# Altium footprint library Connector-Header.PcbLib: 166 footprints (part 8 of 11)
Each footprint in its own frame and in the unit in brackets; x right, y up, seen from the top. Pads: shape width x height; smd on the part's side, far side on the other; paste and mask are expansions set on the pad; w line width, h text height; cw(c..) or ccw(c..) is an arc to the next point about the centre after c.
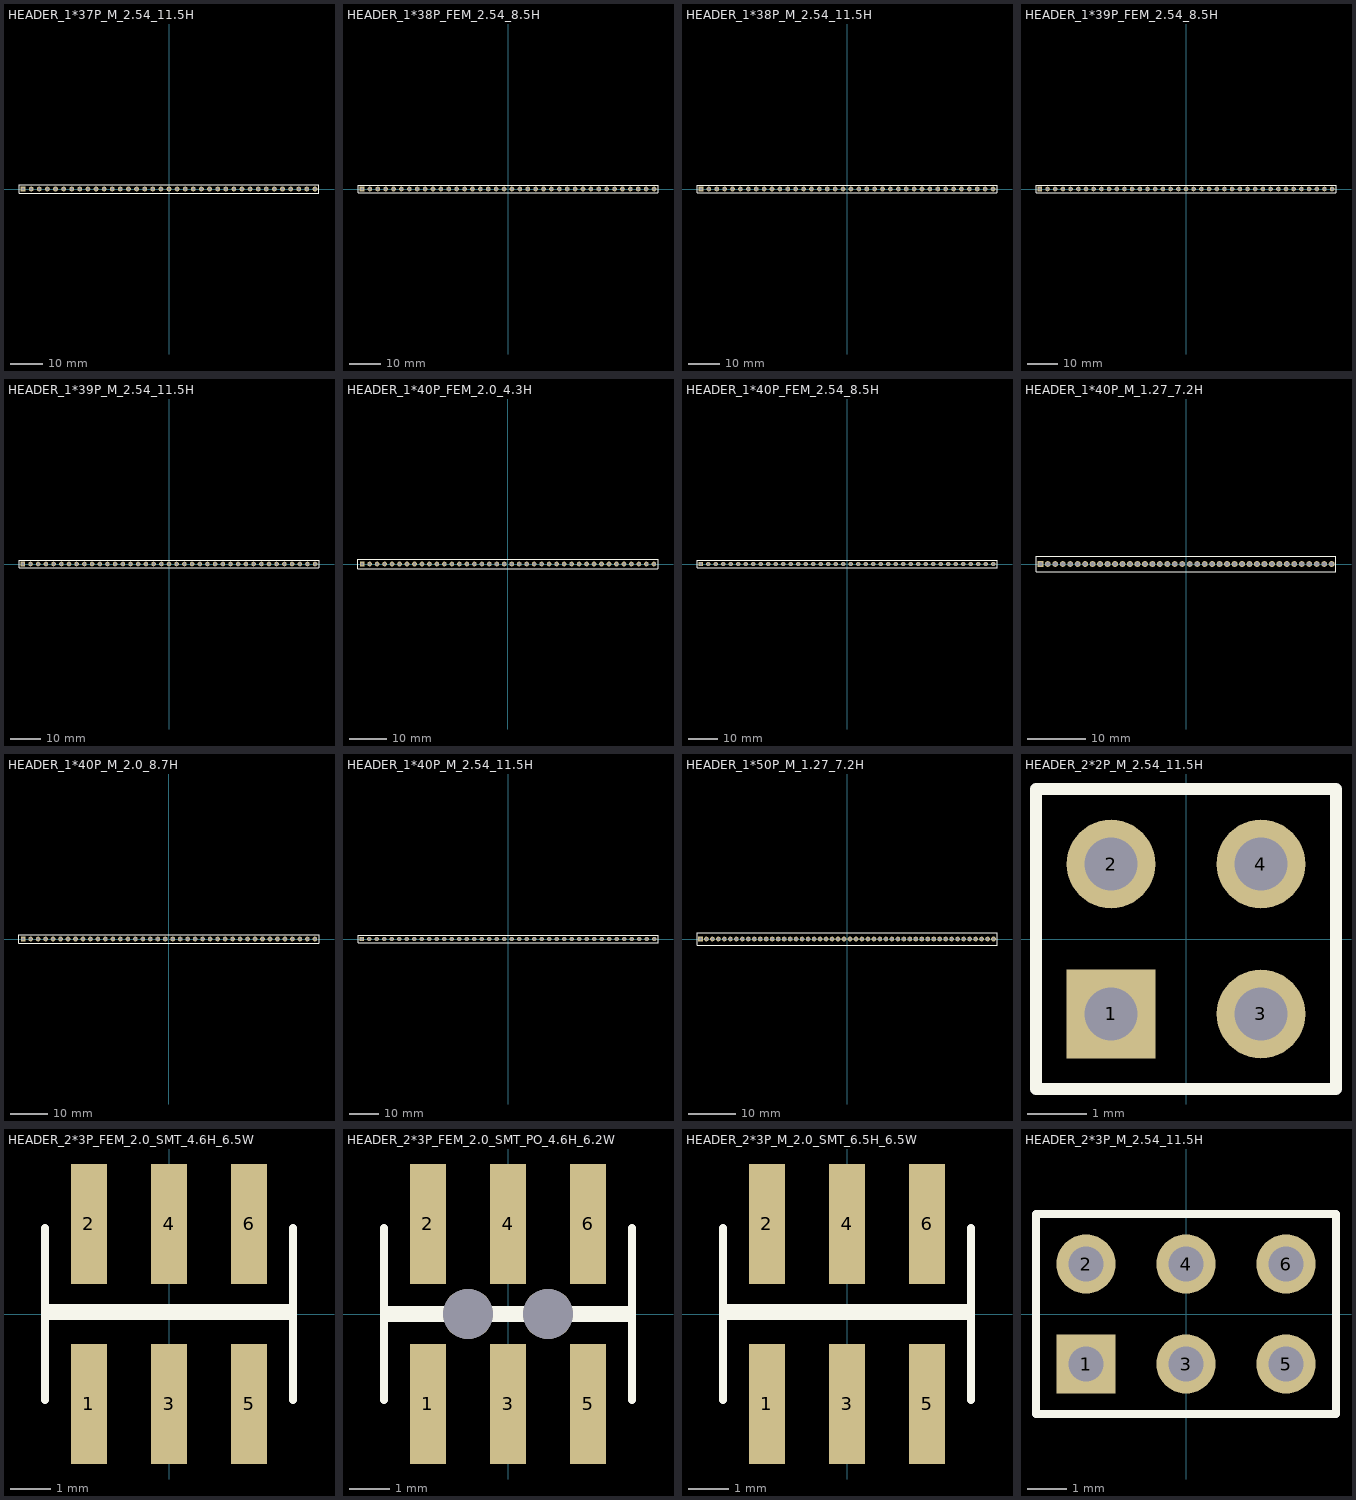
[diagram p7: the footprints below, top view; thin cyan lines are the x and y axes]

## HEADER_1*37P_M_2.54_11.5H [mm] "Connector; Header; 37 Position"
pads (37):
  rect 1.5x1.5 hole 0.9: 1(-45.72,0)
  round 1.5 hole 0.9: 2(-43.18,0) 3(-40.64,0) 4(-38.1,0) 5(-35.56,0) 6(-33.02,0) 7(-30.48,0) 8(-27.94,0) 9(-25.4,0) 10(-22.86,0) 11(-20.32,0) 12(-17.78,0) 13(-15.24,0) 14(-12.7,0) 15(-10.16,0) 16(-7.62,0) 17(-5.08,0) 18(-2.54,0) 19(0,0) 20(2.54,0) 21(5.08,0) 22(7.62,0) 23(10.16,0) 24(12.7,0) 25(15.24,0) 26(17.78,0) 27(20.32,0) 28(22.86,0) 29(25.4,0) 30(27.94,0) 31(30.48,0) 32(33.02,0) 33(35.56,0) 34(38.1,0) 35(40.64,0) 36(43.18,0) 37(45.72,0)
Top Overlay:
  lines w0.2: -46.99,-1.27 46.99,-1.27 46.99,1.27 -45.085,1.27 -46.99,1.27 -46.99,-1.27
3D body "PinHeader_1x37_P2.54mm_Vertical.step": height 8.54, standoff -3, extent -46.99,-1.27 46.99,1.27

## HEADER_1*38P_FEM_2.54_8.5H [mm] "Connector; Header; 38 Position"
pads (38):
  rect 1.5x1.5 hole 0.9: 1(-46.99,0)
  round 1.5 hole 0.9: 2(-44.45,0) 3(-41.91,0) 4(-39.37,0) 5(-36.83,0) 6(-34.29,0) 7(-31.75,0) 8(-29.21,0) 9(-26.67,0) 10(-24.13,0) 11(-21.59,0) 12(-19.05,0) 13(-16.51,0) 14(-13.97,0) 15(-11.43,0) 16(-8.89,0) 17(-6.35,0) 18(-3.81,0) 19(-1.27,0) 20(1.27,0) 21(3.81,0) 22(6.35,0) 23(8.89,0) 24(11.43,0) 25(13.97,0) 26(16.51,0) 27(19.05,0) 28(21.59,0) 29(24.13,0) 30(26.67,0) 31(29.21,0) 32(31.75,0) 33(34.29,0) 34(36.83,0) 35(39.37,0) 36(41.91,0) 37(44.45,0) 38(46.99,0)
Top Overlay:
  lines w0.2: 48.235,-1.27 -48.26,-1.27 -48.26,1.27 -46.355,1.27 48.26,1.27 48.26,-1.27
3D body "PinSocket_1x38_P2.54mm_Vertical.step": height 7, standoff -3.1, extent -48.26,-1.27 48.26,1.27

## HEADER_1*38P_M_2.54_11.5H [mm] "Connector; Header; 38 Position"
pads (38):
  rect 1.5x1.5 hole 0.9: 1(-46.99,0)
  round 1.5 hole 0.9: 2(-44.45,0) 3(-41.91,0) 4(-39.37,0) 5(-36.83,0) 6(-34.29,0) 7(-31.75,0) 8(-29.21,0) 9(-26.67,0) 10(-24.13,0) 11(-21.59,0) 12(-19.05,0) 13(-16.51,0) 14(-13.97,0) 15(-11.43,0) 16(-8.89,0) 17(-6.35,0) 18(-3.81,0) 19(-1.27,0) 20(1.27,0) 21(3.81,0) 22(6.35,0) 23(8.89,0) 24(11.43,0) 25(13.97,0) 26(16.51,0) 27(19.05,0) 28(21.59,0) 29(24.13,0) 30(26.67,0) 31(29.21,0) 32(31.75,0) 33(34.29,0) 34(36.83,0) 35(39.37,0) 36(41.91,0) 37(44.45,0) 38(46.99,0)
Top Overlay:
  lines w0.2: 48.235,-1.27 -48.26,-1.27 -48.26,1.27 -46.355,1.27 48.26,1.27 48.26,-1.27
3D body "PinHeader_1x38_P2.54mm_Vertical.step": height 8.54, standoff -3, extent -48.26,-1.27 48.26,1.27

## HEADER_1*39P_FEM_2.54_8.5H [mm] "Connector; Header; 39 Position"
pads (39):
  rect 1.5x1.5 hole 0.9: 1(-48.26,0)
  round 1.5 hole 0.9: 2(-45.72,0) 3(-43.18,0) 4(-40.64,0) 5(-38.1,0) 6(-35.56,0) 7(-33.02,0) 8(-30.48,0) 9(-27.94,0) 10(-25.4,0) 11(-22.86,0) 12(-20.32,0) 13(-17.78,0) 14(-15.24,0) 15(-12.7,0) 16(-10.16,0) 17(-7.62,0) 18(-5.08,0) 19(-2.54,0) 20(0,0) 21(2.54,0) 22(5.08,0) 23(7.62,0) 24(10.16,0) 25(12.7,0) 26(15.24,0) 27(17.78,0) 28(20.32,0) 29(22.86,0) 30(25.4,0) 31(27.94,0) 32(30.48,0) 33(33.02,0) 34(35.56,0) 35(38.1,0) 36(40.64,0) 37(43.18,0) 38(45.72,0) 39(48.26,0)
Top Overlay:
  lines w0.2: 49.505,-1.27 -49.53,-1.27 -49.53,1.27 -47.625,1.27 49.53,1.27 49.53,-1.27
3D body "PinSocket_1x39_P2.54mm_Vertical.step": height 7, standoff -3.1, extent -49.53,-1.27 49.53,1.27

## HEADER_1*39P_M_2.54_11.5H [mm] "Connector; Header; 39 Position"
pads (39):
  rect 1.5x1.5 hole 0.9: 1(-48.26,0)
  round 1.5 hole 0.9: 2(-45.72,0) 3(-43.18,0) 4(-40.64,0) 5(-38.1,0) 6(-35.56,0) 7(-33.02,0) 8(-30.48,0) 9(-27.94,0) 10(-25.4,0) 11(-22.86,0) 12(-20.32,0) 13(-17.78,0) 14(-15.24,0) 15(-12.7,0) 16(-10.16,0) 17(-7.62,0) 18(-5.08,0) 19(-2.54,0) 20(0,0) 21(2.54,0) 22(5.08,0) 23(7.62,0) 24(10.16,0) 25(12.7,0) 26(15.24,0) 27(17.78,0) 28(20.32,0) 29(22.86,0) 30(25.4,0) 31(27.94,0) 32(30.48,0) 33(33.02,0) 34(35.56,0) 35(38.1,0) 36(40.64,0) 37(43.18,0) 38(45.72,0) 39(48.26,0)
Top Overlay:
  lines w0.2: 49.505,-1.27 -49.53,-1.27 -49.53,1.27 -47.625,1.27 49.53,1.27 49.53,-1.27
3D body "PinHeader_1x39_P2.54mm_Vertical.step": height 8.54, standoff -3, extent -49.53,-1.27 49.53,1.27

## HEADER_1*40P_FEM_2.0_4.3H [mm]
pads (40):
  rect 1.25x1.25 hole 0.85: 1(-39,0)
  round 1.25 hole 0.85: 2(-37,0) 3(-35,0) 4(-33,0) 5(-31,0) 6(-29,0) 7(-27,0) 8(-25,0) 9(-23,0) 10(-21,0) 11(-19,0) 12(-17,0) 13(-15,0) 14(-13,0) 15(-11,0) 16(-9,0) 17(-7,0) 18(-5,0) 19(-3,0) 20(-1,0) 21(1,0) 22(3,0) 23(5,0) 24(7,0) 25(9,0) 26(11,0) 27(13,0) 28(15,0) 29(17,0) 30(19,0) 31(21,0) 32(23,0) 33(25,0) 34(27,0) 35(29,0) 36(31,0) 37(33,0) 38(35,0) 39(37,0) 40(39,0)
Top Overlay:
  lines w0.203: -40.1,-1.3 40.1,-1.3 40.1,1.3 -40.1,1.3 -40.1,-1.3

## HEADER_1*40P_FEM_2.54_8.5H [mm] "Connector; Header; 40 Position"
pads (40):
  rect 1.5x1.5 hole 0.9: 1(-49.53,0)
  round 1.5 hole 0.9: 2(-46.99,0) 3(-44.45,0) 4(-41.91,0) 5(-39.37,0) 6(-36.83,0) 7(-34.29,0) 8(-31.75,0) 9(-29.21,0) 10(-26.67,0) 11(-24.13,0) 12(-21.59,0) 13(-19.05,0) 14(-16.51,0) 15(-13.97,0) 16(-11.43,0) 17(-8.89,0) 18(-6.35,0) 19(-3.81,0) 20(-1.27,0) 21(1.27,0) 22(3.81,0) 23(6.35,0) 24(8.89,0) 25(11.43,0) 26(13.97,0) 27(16.51,0) 28(19.05,0) 29(21.59,0) 30(24.13,0) 31(26.67,0) 32(29.21,0) 33(31.75,0) 34(34.29,0) 35(36.83,0) 36(39.37,0) 37(41.91,0) 38(44.45,0) 39(46.99,0) 40(49.53,0)
Top Overlay:
  lines w0.2: 50.775,1.27 -48.895,1.27 -50.8,1.27 -50.8,-1.27 50.8,-1.27 50.8,1.27
3D body "PinSocket_1x40_P2.54mm_Vertical.step": height 7, standoff -3.1, extent -50.8,-1.27 50.8,1.27

## HEADER_1*40P_M_1.27_7.2H [mm]
pads (40):
  rect 1x1 hole 0.7: 1(-24.765,0)
  round 1 hole 0.7: 2(-23.495,0) 3(-22.225,0) 4(-20.955,0) 5(-19.685,0) 6(-18.415,0) 7(-17.145,0) 8(-15.875,0) 9(-14.605,0) 10(-13.335,0) 11(-12.065,0) 12(-10.795,0) 13(-9.525,0) 14(-8.255,0) 15(-6.985,0) 16(-5.715,0) 17(-4.445,0) 18(-3.175,0) 19(-1.905,0) 20(-0.635,0) 21(0.635,0) 22(1.905,0) 23(3.175,0) 24(4.445,0) 25(5.715,0) 26(6.985,0) 27(8.255,0) 28(9.525,0) 29(10.795,0) 30(12.065,0) 31(13.335,0) 32(14.605,0) 33(15.875,0) 34(17.145,0) 35(18.415,0) 36(19.685,0) 37(20.955,0) 38(22.225,0) 39(23.495,0) 40(24.765,0)
Top Overlay:
  lines w0.203: -25.502,-1.321 -25.502,1.321 25.502,1.321 25.502,-1.321 -25.502,-1.321

## HEADER_1*40P_M_2.0_8.7H [mm]
pads (40):
  rect 1.25x1.25 hole 0.85: 1(-39,0)
  round 1.25 hole 0.85: 2(-37,0) 3(-35,0) 4(-33,0) 5(-31,0) 6(-29,0) 7(-27,0) 8(-25,0) 9(-23,0) 10(-21,0) 11(-19,0) 12(-17,0) 13(-15,0) 14(-13,0) 15(-11,0) 16(-9,0) 17(-7,0) 18(-5,0) 19(-3,0) 20(-1,0) 21(1,0) 22(3,0) 23(5,0) 24(7,0) 25(9,0) 26(11,0) 27(13,0) 28(15,0) 29(17,0) 30(19,0) 31(21,0) 32(23,0) 33(25,0) 34(27,0) 35(29,0) 36(31,0) 37(33,0) 38(35,0) 39(37,0) 40(39,0)
Top Overlay:
  lines w0.203: -40.1,-1.1 -40.1,1.1 40.1,1.1 40.1,-1.1 -40.1,-1.1

## HEADER_1*40P_M_2.54_11.5H [mm] "Connector; Header; 40 Position"
pads (40):
  rect 1.5x1.5 hole 0.9: 1(-49.53,0)
  round 1.5 hole 0.9: 2(-46.99,0) 3(-44.45,0) 4(-41.91,0) 5(-39.37,0) 6(-36.83,0) 7(-34.29,0) 8(-31.75,0) 9(-29.21,0) 10(-26.67,0) 11(-24.13,0) 12(-21.59,0) 13(-19.05,0) 14(-16.51,0) 15(-13.97,0) 16(-11.43,0) 17(-8.89,0) 18(-6.35,0) 19(-3.81,0) 20(-1.27,0) 21(1.27,0) 22(3.81,0) 23(6.35,0) 24(8.89,0) 25(11.43,0) 26(13.97,0) 27(16.51,0) 28(19.05,0) 29(21.59,0) 30(24.13,0) 31(26.67,0) 32(29.21,0) 33(31.75,0) 34(34.29,0) 35(36.83,0) 36(39.37,0) 37(41.91,0) 38(44.45,0) 39(46.99,0) 40(49.53,0)
Top Overlay:
  lines w0.2: 50.775,1.27 -48.895,1.27 -50.8,1.27 -50.8,-1.27 50.8,-1.27 50.8,1.27
3D body "PinHeader_1x40_P2.54mm_Vertical.step": height 8.54, standoff -3, extent -50.8,-1.27 50.8,1.27

## HEADER_1*50P_M_1.27_7.2H [mm]
pads (50):
  rect 1x1 hole 0.7: 1(-31.115,0)
  round 1 hole 0.7: 2(-29.845,0) 3(-28.575,0) 4(-27.305,0) 5(-26.035,0) 6(-24.765,0) 7(-23.495,0) 8(-22.225,0) 9(-20.955,0) 10(-19.685,0) 11(-18.415,0) 12(-17.145,0) 13(-15.875,0) 14(-14.605,0) 15(-13.335,0) 16(-12.065,0) 17(-10.795,0) 18(-9.525,0) 19(-8.255,0) 20(-6.985,0) 21(-5.715,0) 22(-4.445,0) 23(-3.175,0) 24(-1.905,0) 25(-0.635,0) 26(0.635,0) 27(1.905,0) 28(3.175,0) 29(4.445,0) 30(5.715,0) 31(6.985,0) 32(8.255,0) 33(9.525,0) 34(10.795,0) 35(12.065,0) 36(13.335,0) 37(14.605,0) 38(15.875,0) 39(17.145,0) 40(18.415,0) 41(19.685,0) 42(20.955,0) 43(22.225,0) 44(23.495,0) 45(24.765,0) 46(26.035,0) 47(27.305,0) 48(28.575,0) 49(29.845,0) 50(31.115,0)
Top Overlay:
  lines w0.203: -31.852,-1.321 31.852,-1.321 31.852,1.321 -31.852,1.321 -31.852,-1.321

## HEADER_2*2P_M_2.54_11.5H [mm] "Connector; Header; 2x2 Position"
pads (4):
  rect 1.5x1.5 hole 0.9: 1(-1.27,-1.27)
  round 1.5 hole 0.9: 2(-1.27,1.27) 3(1.27,-1.27) 4(1.27,1.27)
Top Overlay:
  lines w0.2: -2.54,-2.54 -2.54,2.54 2.54,2.54 2.54,-2.54 -2.54,-2.54

## HEADER_2*3P_FEM_2.0_SMT_4.6H_6.5W [mm]
pads (6):
  rect 0.9x3 smd: 1(-2,-2.25) 2(-2,2.25) 3(0,-2.25) 4(0,2.25) 5(2,-2.25) 6(2,2.25)
Top Overlay:
  lines w0.203: -3.1,-2.15 -3.1,2.15 ; -3.1,-0.05 3,-0.05 ; -3.1,0.15 3,0.15 ; 3.1,-2.15 3.1,2.15

## HEADER_2*3P_FEM_2.0_SMT_PO_4.6H_6.2W [mm]
pads (8):
  rect 0.9x3 smd: 1(-2,-2.25) 2(-2,2.25) 3(0,-2.25) 4(0,2.25) 5(2,-2.25) 6(2,2.25)
  round 1.25 hole 1.25: ""(-1,0) ""(1,0)
Top Overlay:
  lines w0.203: -3.1,-2.15 -3.1,2.15 ; -3.1,-0.1 3,-0.1 ; -3.1,0.1 3,0.1 ; 3.1,-2.15 3.1,2.15

## HEADER_2*3P_M_2.0_SMT_6.5H_6.5W [mm]
pads (6):
  rect 0.9x3 smd: 1(-2,-2.25) 2(-2,2.25) 3(0,-2.25) 4(0,2.25) 5(2,-2.25) 6(2,2.25)
Top Overlay:
  lines w0.203: -3.1,-2.15 -3.1,2.15 ; -3.1,-0.05 3,-0.05 ; -3.1,0.15 3,0.15 ; 3.1,-2.15 3.1,2.15

## HEADER_2*3P_M_2.54_11.5H [mm] "Connector; Header; 3x2 Position"
pads (6):
  rect 1.5x1.5 hole 0.9: 1(-2.54,-1.27)
  round 1.5 hole 0.9: 2(-2.54,1.27) 3(0,-1.27) 4(0,1.27) 5(2.54,-1.27) 6(2.54,1.27)
Top Overlay:
  lines w0.2: -1.058,-2.54 3.81,-2.54 ; 3.81,-2.54 3.81,2.54 -3.81,2.54 -3.81,-2.54 3.81,-2.54